# Altium footprint library EPCOS.PcbLib: 178 footprints (part 8 of 12)
Each footprint in its own frame and in the unit in brackets; x right, y up, seen from the top. Pads: shape width x height; smd on the part's side, far side on the other; paste and mask are expansions set on the pad; w line width, h text height; cw(c..) or ccw(c..) is an arc to the next point about the centre after c.
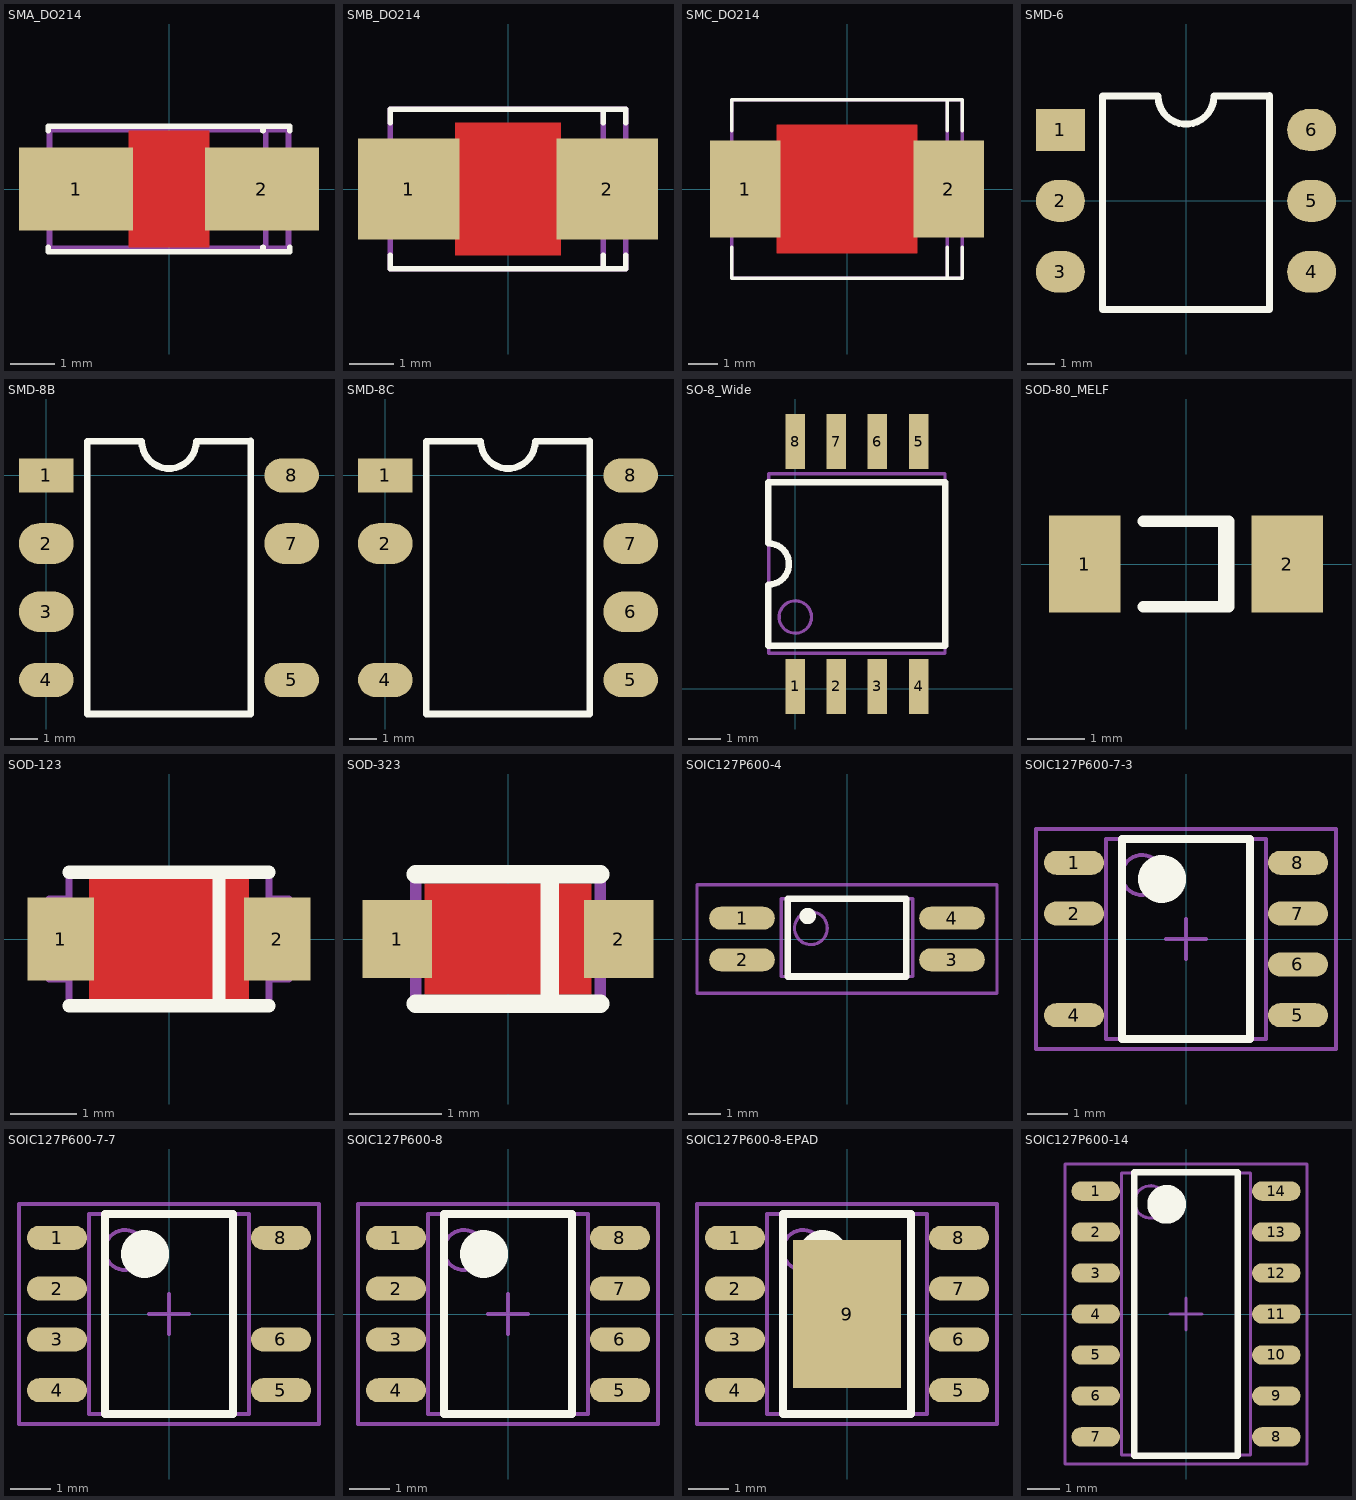
[diagram p7: the footprints below, top view; thin cyan lines are the x and y axes]

## SMA_DO214 [mm] "DO-214-AC/SMA; 2 C-Bend Leads; Body 5.3 x 2.6 mm"
height 2.34
pads (2):
  rect 2.55x1.85 smd: 1(-2.075,0) 2(2.075,0)
Top Layer:
  pour cut-out: -0.9,1.3 0.9,1.3 0.9,-1.3 -0.9,-1.3
Top Overlay:
  lines w0.127: -2.7,-1.3 -2.7,-1.4 2.7,-1.4 2.7,-1.3 ; -2.7,1.3 -2.7,1.4 2.7,1.4 2.7,1.3 ; 2.1,-1.4 2.1,-1.3 ; 2.1,1.3 2.1,1.4
Mechanical 1:
  lines w0.1: -0.2,0 0.2,0 ; 0,-0.2 0,0.2
Mechanical 13:
  lines w0.127: -2.667,-0.762 -2.946,-0.762 -2.946,0.762 -2.667,0.762 ; 2.159,-1.321 2.159,1.321 ; 2.667,-0.762 2.946,-0.762 2.946,0.762 2.667,0.762 ; -2.667,-1.321 -2.667,-1.016 -2.667,1.321 2.667,1.321 2.667,-1.321 -2.667,-1.321
3D body "User Library-DO-214AC_SMA.step": height 2.25, standoff 0.05, extent -2.5,-1.35 2.5,1.35

## SMB_DO214 [mm] "DO-214-AA/SMB; 2 C-Bend Leads; Body 5.3 x 3.6 mm"
height 2.54
pads (2):
  rect 2.3x2.3 smd: 1(-2.25,0) 2(2.25,0)
Top Layer:
  pour cut-out: -1.2,1.5 1.2,1.5 1.2,-1.5 -1.2,-1.5
Top Overlay:
  lines w0.127: -2.667,-1.5 -2.667,-1.803 2.667,-1.803 2.667,-1.5 ; -2.667,1.5 -2.667,1.803 2.667,1.803 2.667,1.5 ; 2.159,-1.803 2.159,-1.5 ; 2.159,1.5 2.159,1.803
Mechanical 1:
  lines w0.1: -0.2,0 0.2,0 ; 0,-0.2 0,0.2
Mechanical 13:
  lines w0.127: -2.667,-1.016 -2.946,-1.016 -2.946,1.016 -2.667,1.016 ; 2.159,-1.803 2.159,1.803 ; 2.667,-1.016 2.946,-1.016 2.946,1.016 2.667,1.016 ; -2.667,-1.803 2.667,-1.803 2.667,-1.778 2.667,1.803 -2.667,1.803 -2.667,-1.803
3D body "User Library-DO-214AA_SMB.step": height 2.3, standoff 0.05, extent -2.65,-1.8 2.65,1.9

## SMC_DO214 [mm] "DO-214-AB/SMC; 2 C-Bend Leads; Body 7.9 x 5.9 mm"
height 2.54
pads (2):
  rect 2.4x3.3 smd: 1(-3.475,0) 2(3.475,0)
Top Layer:
  pour cut-out: -2.4,2.2 2.4,2.2 2.4,-2.2 -2.4,-2.2
Top Overlay:
  lines w0.127: -3.937,-2 -3.937,-3.048 3.937,-3.048 3.937,-2 ; -3.937,2 -3.937,3.048 3.937,3.048 3.937,2 ; 3.429,-3.048 3.429,-2 ; 3.429,2 3.429,3.048
Mechanical 1:
  lines w0.1: -0.2,0 0.2,0 ; 0,-0.2 0,0.2
Mechanical 13:
  lines w0.127: -3.937,-1.27 -4.216,-1.27 -4.216,1.27 -3.937,1.27 ; 3.429,-3.048 3.429,3.048 ; 3.937,-1.27 4.216,-1.27 4.216,1.27 3.937,1.27 ; -3.937,-3.048 3.937,-3.048 3.937,3.048 -3.937,3.048 -3.937,-3.048
3D body "User Library-DO-214AB-SMC.step": height 2.5, standoff 0.05, extent -3.9,-2.95 3.9,2.95

## SMD-6 [mm]
height 4
pads (6):
  rect 1.75x1.5 smd: 1(-4.5,2.54)
  oval 1.75x1.5 smd: 2(-4.5,0) 3(-4.5,-2.54) 4(4.5,-2.54) 5(4.5,0) 6(4.5,2.54)
Top Overlay:
  lines w0.25: 3,3.75 1,3.75 cw(c0,3.75) -1,3.75 -3,3.75 -3,-3.9 3,-3.9 3,3.77
3D body "User Library-DIP-6-SMD.step": height 3.76, standoff 0.05, extent -4.9,-3.6 4.9,3.65

## SMD-8B [mm]
height 4
pads (7):
  rect 2x1.25 smd: 1(0,0)
  oval 2x1.5 smd: 2(0,-2.5) 3(0,-5) 7(9,-2.5)
  oval 2x1.25 smd: 4(0,-7.5) 5(9,-7.5) 8(9,0)
Top Overlay:
  lines w0.25: 7.5,1.25 5.5,1.25 cw(c4.5,1.25) 3.5,1.25 1.5,1.25 1.5,-8.75 7.5,-8.75 7.5,1.27
3D body "User Library-SMD-8B.step": height 4, standoff 0, extent -0.4,-8.69 9.4,1.16

## SMD-8C [mm]
height 4
pads (7):
  rect 2x1.25 smd: 1(0,0)
  oval 2x1.5 smd: 2(0,-2.5) 6(9,-5) 7(9,-2.5)
  oval 2x1.25 smd: 4(0,-7.5) 5(9,-7.5) 8(9,0)
Top Overlay:
  lines w0.25: 7.5,1.25 5.5,1.25 cw(c4.5,1.25) 3.5,1.25 1.5,1.25 1.5,-8.75 7.5,-8.75 7.5,1.27
3D body "User Library-SMD-8C.step": height 4, standoff 0, extent -0.4,-8.65 9.4,1.2

## SO-8_Wide [mm]
height 1.73
pads (8):
  rect 0.6x1.7 smd: 1(0,0.07) 2(1.27,0.07) 3(2.54,0.07) 4(3.81,0.07) 5(3.81,7.62) 6(2.54,7.62) 7(1.27,7.62) 8(0,7.62)
Top Overlay:
  lines w0.2: -0.82,1.32 4.63,1.32 4.63,6.37 -0.82,6.37 -0.82,4.48 cw(c-0.82,3.845) -0.82,3.21 -0.82,1.32
Mechanical 13:
  circle w0.1: c0.008,2.21 r0.5
  lines w0.1: -0.813,1.092 -0.813,6.629 4.623,6.629 4.623,1.092 -0.813,1.092
3D body "User Library-SO-8W.STEP": height 1.95, standoff 0, extent -0.745,-0.089 4.555,7.811

## SOD-80_MELF [mm] "MiniMELF Diode; Body 3.5 x 1.6 mm"
height 1.6
pads (2):
  rect 1.25x1.7 smd: 1(-1.775,0) 2(1.775,0)
Top Overlay:
  lines w0.2: -0.75,-0.75 0.75,-0.75 0.75,0.75 -0.75,0.75 ; 0.66,-0.75 0.66,0.75
3D body "SOD-80 QuadroMELF.stp": height 1.55, standoff -0.05, extent -1.85,-0.775 1.85,0.825

## SOD-123 [mm]
height 1.35
pads (2):
  rect 1x1.25 smd: 1(-1.625,0) 2(1.625,0)
Top Layer:
  pour cut-out: -1.2,0.9 1.2,0.9 1.2,-0.9 -1.2,-0.9
Top Overlay:
  lines w0.2: -1.5,-1 1.5,-1 ; -1.5,1 1.5,1 ; 0.75,-1 0.75,1
Mechanical 1:
  lines w0.1: -0.2,0 0.2,0 ; 0,-0.2 0,0.2
Mechanical 13:
  lines w0.1: -1.5,-0.6 -1.8,-0.6 -1.8,0.6 -1.5,0.6 ; 1,-1 1,1 ; 1.5,-0.6 1.8,-0.6 1.8,0.6 1.5,0.6 ; -1.5,-1 1.5,-1 1.5,1 -1.5,1 -1.5,-1
3D body "SOD-123_J.stp": height 1.3, standoff 0.04, extent -1.854,-0.775 1.854,0.775

## SOD-323 [mm]
height 1
pads (2):
  rect 0.75x0.85 smd: 1(-1.2,0) 2(1.2,0)
Top Layer:
  pour cut-out: -0.9,0.6 0.9,0.6 0.9,-0.6 -0.9,-0.6
Top Overlay:
  lines w0.2: -1,-0.7 1,-0.7 ; -1,0.7 1,0.7 ; 0.45,-0.7 0.45,0.7
Mechanical 1:
  lines w0.1: -0.2,0 0.2,0 ; 0,-0.2 0,0.2
Mechanical 13:
  lines w0.127: -1,-0.7 -1,0.7 1,0.7 1,-0.7 -1,-0.7
3D body "SOD-323_J.stp": height 0.94, standoff -0.01, extent -1.342,-0.65 1.342,0.65

## SOIC127P600-4 [mm]
height 2.718
pads (4):
  oval 2x0.7 smd: 1(-3.2,0.635) 2(-3.2,-0.635) 3(3.2,-0.635) 4(3.2,0.635)
Top Overlay:
  circle w0.25: c-1.2,0.7 r0.125
  lines w0.2: -1.8,-1.143 1.8,-1.143 1.8,1.23 -1.8,1.23 -1.8,-1.143
Mechanical 13:
  circle w0.1: c-1.1,0.33 r0.5
  lines w0.1: -2,-1.143 2,-1.143 2,1.23 -2,1.23 -2,-1.143
Mechanical 15:
  lines w0.1: -4.572,-1.651 4.572,-1.651 4.572,1.651 -4.572,1.651 -4.572,-1.651
3D body "User Library-TLP290.step": height 2.1, standoff 0.01, extent -3.5,-1.257 3.5,1.343

## SOIC127P600-7-3 [mm]
height 1.73
pads (7):
  oval 1.5x0.6 smd: 1(-2.8,1.905) 2(-2.8,0.635) 4(-2.8,-1.905) 5(2.8,-1.905) 6(2.8,-0.635) 7(2.8,0.635) 8(2.8,1.905)
Top Overlay:
  circle w0.6: c-0.6,1.5 r0.3
  lines w0.2: -1.6,-2.5 -1.6,2.5 1.6,2.5 1.6,-2.5 -1.6,-2.5
Mechanical 13:
  circle w0.1: c-1.1,1.6 r0.5
  lines w0.1: -2,-2.5 -2,2.5 2,2.5 2,-2.5 -2,-2.5
Mechanical 15:
  lines w0.1: -0.5,0 0.5,0 ; 0,-0.5 0,0.5 ; -3.75,-2.75 -3.75,2.75 3.75,2.75 3.75,-2.75 -3.75,-2.75
3D body "User Library-SOIC-7-1.step": height 1.75, standoff 0, extent -3,-2.45 3,2.45

## SOIC127P600-7-7 [mm]
height 1.73
pads (7):
  oval 1.5x0.6 smd: 1(-2.8,1.905) 2(-2.8,0.635) 3(-2.8,-0.635) 4(-2.8,-1.905) 5(2.8,-1.905) 6(2.8,-0.635) 8(2.8,1.905)
Top Overlay:
  circle w0.6: c-0.6,1.5 r0.3
  lines w0.2: -1.6,-2.5 1.6,-2.5 1.6,2.5 -1.6,2.5 -1.6,-2.5
Mechanical 13:
  circle w0.1: c-1.1,1.6 r0.5
  lines w0.1: -2,-2.5 2,-2.5 2,2.5 -2,2.5 -2,-2.5
Mechanical 15:
  lines w0.1: -0.5,0 0.5,0 ; 0,-0.5 0,0.5 ; -3.75,-2.75 3.75,-2.75 3.75,2.75 -3.75,2.75 -3.75,-2.75
3D body "User Library-SOIC-7_2.step": height 1.75, standoff 0, extent -3,-2.45 3,2.45

## SOIC127P600-8 [mm]
height 1.73
pads (8):
  oval 1.5x0.6 smd: 1(-2.8,1.905) 2(-2.8,0.635) 3(-2.8,-0.635) 4(-2.8,-1.905) 5(2.8,-1.905) 6(2.8,-0.635) 7(2.8,0.635) 8(2.8,1.905)
Top Overlay:
  circle w0.6: c-0.6,1.5 r0.3
  lines w0.2: -1.6,-2.5 1.6,-2.5 1.6,2.5 -1.6,2.5 -1.6,-2.5
Mechanical 13:
  circle w0.1: c-1.1,1.6 r0.5
  lines w0.1: -2,-2.5 2,-2.5 2,2.5 -2,2.5 -2,-2.5
Mechanical 15:
  lines w0.1: -0.5,0 0.5,0 ; 0,-0.5 0,0.5 ; -3.75,-2.75 3.75,-2.75 3.75,2.75 -3.75,2.75 -3.75,-2.75
3D body "User Library-SOIC8_JEDEC_MS-012AA.step": height 1.75, standoff -0.01, extent -3.1,-2.5 3.1,2.5

## SOIC127P600-8-EPAD [mm]
height 1.73
pads (9):
  oval 1.5x0.6 smd: 1(-2.8,1.905) 2(-2.8,0.635) 3(-2.8,-0.635) 4(-2.8,-1.905) 5(2.8,-1.905) 6(2.8,-0.635) 7(2.8,0.635) 8(2.8,1.905)
  rect 2.71x3.7 smd: 9(0,0)
Top Overlay:
  circle w0.6: c-0.6,1.5 r0.3
  lines w0.2: -1.6,-2.5 1.6,-2.5 1.6,2.5 -1.6,2.5 -1.6,-2.5
Mechanical 13:
  circle w0.1: c-1.1,1.6 r0.5
  lines w0.1: -2,-2.5 2,-2.5 2,2.5 -2,2.5 -2,-2.5
Mechanical 15:
  lines w0.1: -0.5,0 0.5,0 ; 0,-0.5 0,0.5 ; -3.75,-2.75 3.75,-2.75 3.75,2.75 -3.75,2.75 -3.75,-2.75
3D body "User Library-SOIC8_JEDEC_MS-012AA.step": height 1.75, standoff -0.01, extent -3.1,-2.5 3.1,2.5

## SOIC127P600-14 [mm]
height 1.73
pads (14):
  oval 1.5x0.6 smd: 1(-2.8,3.81) 2(-2.8,2.54) 3(-2.8,1.27) 4(-2.8,0) 5(-2.8,-1.27) 6(-2.8,-2.54) 7(-2.8,-3.81) 8(2.8,-3.81) 9(2.8,-2.54) 10(2.8,-1.27) 11(2.8,0) 12(2.8,1.27) 13(2.8,2.54) 14(2.8,3.81)
Top Overlay:
  circle w0.6: c-0.6,3.4 r0.3
  lines w0.2: -1.6,-4.4 -1.6,4.4 1.6,4.4 1.6,-4.4 -1.6,-4.4
Mechanical 13:
  circle w0.1: c-1.1,3.475 r0.5
  lines w0.1: -2,-4.375 -2,4.375 2,4.375 2,-4.375 -2,-4.375
Mechanical 15:
  lines w0.1: -0.5,0 0.5,0 ; 0,-0.5 0,0.5 ; -3.75,-4.65 -3.75,4.65 3.75,4.65 3.75,-4.65 -3.75,-4.65
3D body "CircuitWorks-SO-14 (PIC16F684).step": height 1.6, standoff 0, extent -2.995,-4.345 2.995,4.345